# Altium footprint library con-molex.PCBLIB: 369 footprints (part 19 of 26)
Each footprint in its own frame and in the unit in brackets; x right, y up, seen from the top. Pads: shape width x height; smd on the part's side, far side on the other; paste and mask are expansions set on the pad; w line width, h text height; cw(c..) or ccw(c..) is an arc to the next point about the centre after c.
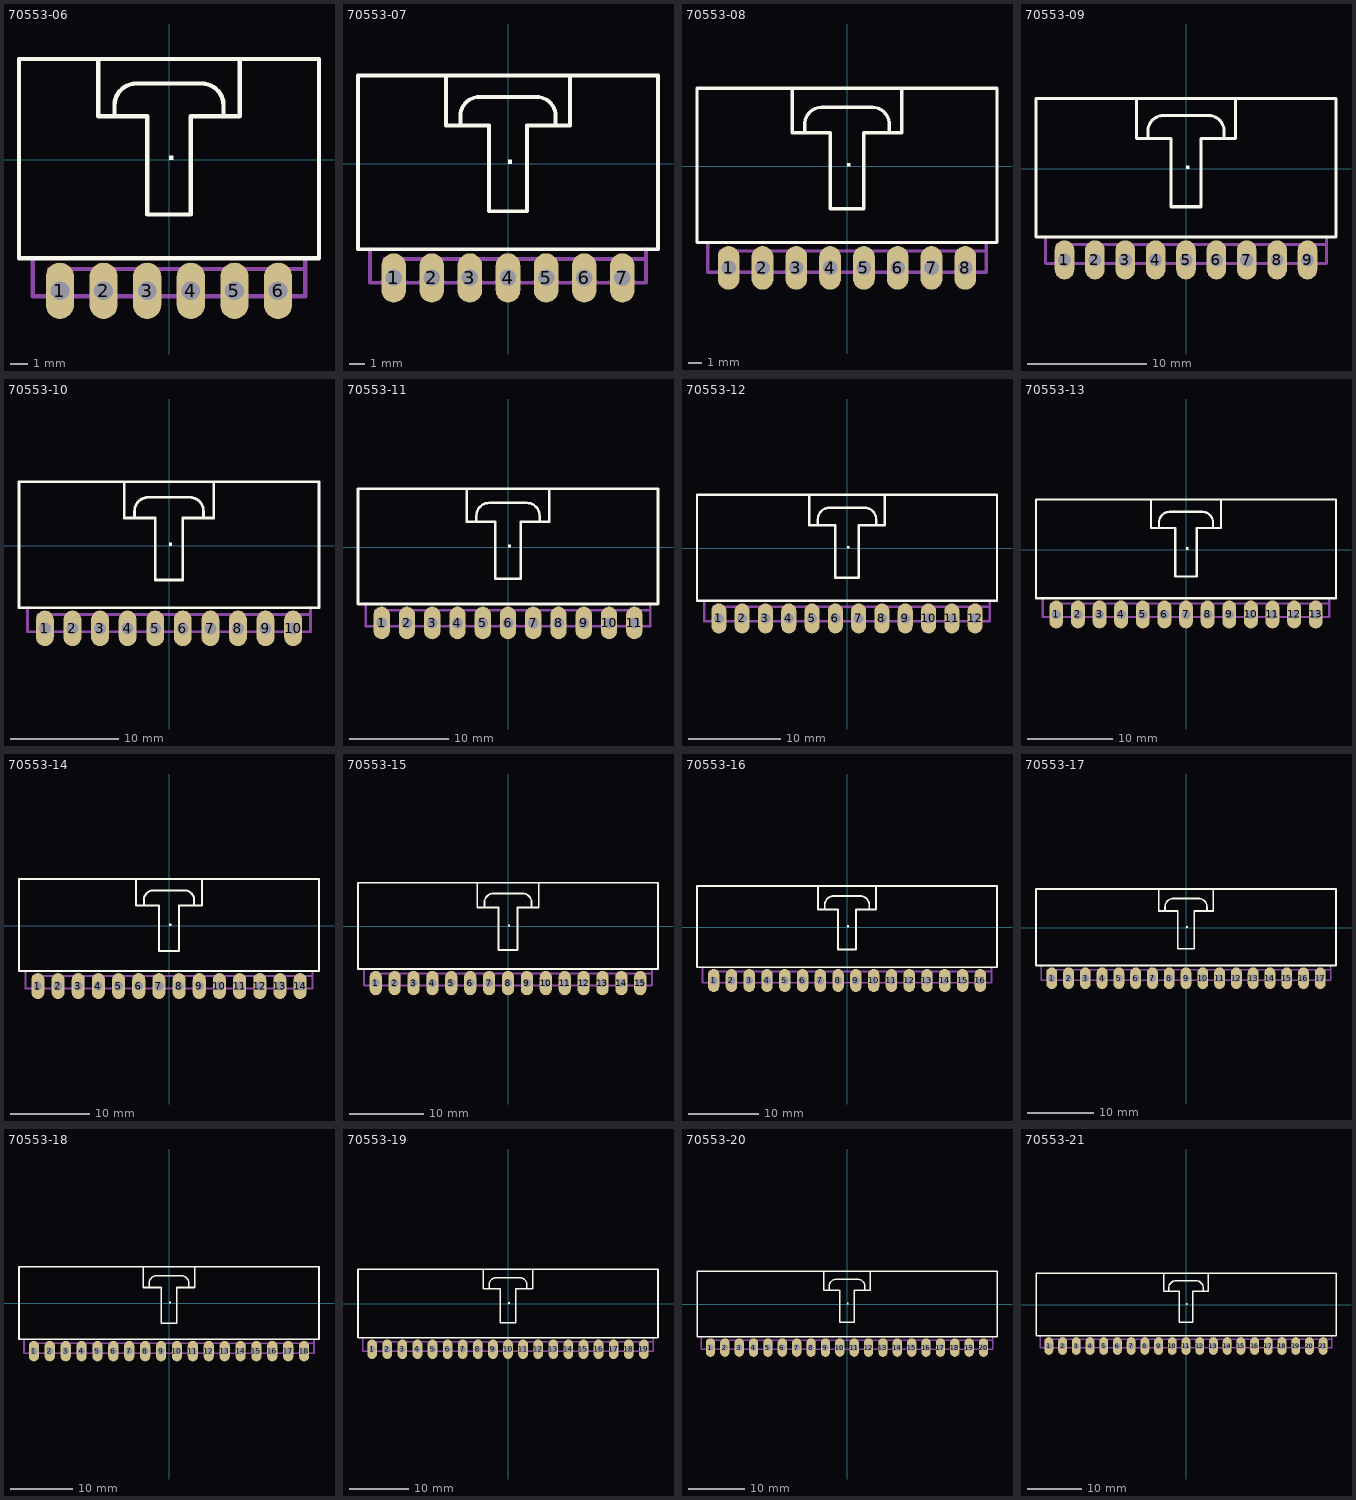
[diagram p18: the footprints below, top view; thin cyan lines are the x and y axes]

## 70553-06 [mil]
pads (6):
  oval 64.5x129 hole 43: 1(-250,-300) 2(-150,-300) 3(-50,-300) 4(50,-300) 5(150,-300) 6(250,-300)
Top Overlay:
  region: 0,0 10,0 10,10 0,10
  lines w10: -162.5,231.25 -162.5,100 -125,100 ; -125,100 -50,100 -50,-125 50,-125 50,100 125,100 ; -125,100 -125,125 cw(c-75,125) -75,175 75,175 cw(c75,125) 125,125 125,100 ; 125,100 162.5,100 162.5,231.25 ; 162.5,231.25 343.75,231.25 343.75,-225 -343.75,-225 -343.75,231.25 162.5,231.25
Mechanical 16:
  rectangle: -262.5,-300 -237.5,-250
  rectangle: -162.5,-300 -137.5,-250
  rectangle: -62.5,-300 -37.5,-250
  rectangle: 37.5,-300 62.5,-250
  rectangle: 137.5,-300 162.5,-250
  rectangle: 237.5,-300 262.5,-250
  lines w5: -275,-250 -225,-250 ; -175,-250 -125,-250 ; -75,-250 -25,-250 ; 25,-250 75,-250 ; 125,-250 175,-250 ; 225,-250 275,-250
  lines w10: -312.5,-225 -312.5,-312.5 -285,-312.5 ccw(c-285,-302.5) -275,-302.5 -275,-250 ; 312.5,-225 312.5,-250 ; 312.5,-250 312.5,-312.5 285,-312.5 cw(c285,-302.5) 275,-302.5 275,-250 312.5,-250 ; -225,-302.5 -225,-250 -175,-250 -175,-302.5 cw(c-185,-302.5) -185,-312.5 -215,-312.5 cw(c-215,-302.5) -225,-302.5 ; -125,-302.5 -125,-250 -75,-250 -75,-302.5 cw(c-85,-302.5) -85,-312.5 -115,-312.5 cw(c-115,-302.5) -125,-302.5 ; -25,-302.5 -25,-250 25,-250 25,-302.5 cw(c15,-302.5) 15,-312.5 -15,-312.5 cw(c-15,-302.5) -25,-302.5 ; 75,-302.5 75,-250 125,-250 125,-302.5 cw(c115,-302.5) 115,-312.5 85,-312.5 cw(c85,-302.5) 75,-302.5 ; 175,-302.5 175,-250 225,-250 225,-302.5 cw(c215,-302.5) 215,-312.5 185,-312.5 cw(c185,-302.5) 175,-302.5

## 70553-07 [mil]
pads (7):
  oval 64.5x129 hole 43: 1(-300,-300) 2(-200,-300) 3(-100,-300) 4(0,-300) 5(100,-300) 6(200,-300) 7(300,-300)
Top Overlay:
  region: 0,0 10,0 10,10 0,10
  lines w10: -162.5,231.25 -162.5,100 -125,100 ; -125,100 -50,100 -50,-125 50,-125 50,100 125,100 ; -125,100 -125,125 cw(c-75,125) -75,175 75,175 cw(c75,125) 125,125 125,100 ; 125,100 162.5,100 162.5,231.25 ; 162.5,231.25 393.75,231.25 393.75,-225 -393.75,-225 -393.75,231.25 162.5,231.25
Mechanical 16:
  rectangle: -312.5,-300 -287.5,-250
  rectangle: -212.5,-300 -187.5,-250
  rectangle: -112.5,-300 -87.5,-250
  rectangle: -12.5,-300 12.5,-250
  rectangle: 87.5,-300 112.5,-250
  rectangle: 187.5,-300 212.5,-250
  rectangle: 287.5,-300 312.5,-250
  lines w5: -325,-250 -275,-250 ; -225,-250 -175,-250 ; -125,-250 -75,-250 ; -25,-250 25,-250 ; 75,-250 125,-250 ; 175,-250 225,-250 ; 275,-250 325,-250
  lines w10: -362.5,-225 -362.5,-312.5 -335,-312.5 ccw(c-335,-302.5) -325,-302.5 -325,-250 ; 362.5,-225 362.5,-250 ; 362.5,-250 362.5,-312.5 335,-312.5 cw(c335,-302.5) 325,-302.5 325,-250 362.5,-250 ; -275,-302.5 -275,-250 -225,-250 -225,-302.5 cw(c-235,-302.5) -235,-312.5 -265,-312.5 cw(c-265,-302.5) -275,-302.5 ; -175,-302.5 -175,-250 -125,-250 -125,-302.5 cw(c-135,-302.5) -135,-312.5 -165,-312.5 cw(c-165,-302.5) -175,-302.5 ; -75,-302.5 -75,-250 -25,-250 -25,-302.5 cw(c-35,-302.5) -35,-312.5 -65,-312.5 cw(c-65,-302.5) -75,-302.5 ; 25,-302.5 25,-250 75,-250 75,-302.5 cw(c65,-302.5) 65,-312.5 35,-312.5 cw(c35,-302.5) 25,-302.5 ; 125,-302.5 125,-250 175,-250 175,-302.5 cw(c165,-302.5) 165,-312.5 135,-312.5 cw(c135,-302.5) 125,-302.5 ; 225,-302.5 225,-250 275,-250 275,-302.5 cw(c265,-302.5) 265,-312.5 235,-312.5 cw(c235,-302.5) 225,-302.5

## 70553-08 [mil]
pads (8):
  oval 64.5x129 hole 43: 1(-350,-300) 2(-250,-300) 3(-150,-300) 4(-50,-300) 5(50,-300) 6(150,-300) 7(250,-300) 8(350,-300)
Top Overlay:
  region: 0,0 10,0 10,10 0,10
  lines w10: -162.5,231.25 -162.5,100 -125,100 ; -125,100 -50,100 -50,-125 50,-125 50,100 125,100 ; -125,100 -125,125 cw(c-75,125) -75,175 75,175 cw(c75,125) 125,125 125,100 ; 125,100 162.5,100 162.5,231.25 ; 162.5,231.25 443.75,231.25 443.75,-225 -443.75,-225 -443.75,231.25 162.5,231.25
Mechanical 16:
  rectangle: -362.5,-300 -337.5,-250
  rectangle: -262.5,-300 -237.5,-250
  rectangle: -162.5,-300 -137.5,-250
  rectangle: -62.5,-300 -37.5,-250
  rectangle: 37.5,-300 62.5,-250
  rectangle: 137.5,-300 162.5,-250
  rectangle: 237.5,-300 262.5,-250
  rectangle: 337.5,-300 362.5,-250
  lines w5: -375,-250 -325,-250 ; -275,-250 -225,-250 ; -175,-250 -125,-250 ; -75,-250 -25,-250 ; 25,-250 75,-250 ; 125,-250 175,-250 ; 225,-250 275,-250 ; 325,-250 375,-250
  lines w10: -412.5,-225 -412.5,-312.5 -385,-312.5 ccw(c-385,-302.5) -375,-302.5 -375,-250 ; 412.5,-225 412.5,-250 ; 412.5,-250 412.5,-312.5 385,-312.5 cw(c385,-302.5) 375,-302.5 375,-250 412.5,-250 ; -325,-302.5 -325,-250 -275,-250 -275,-302.5 cw(c-285,-302.5) -285,-312.5 -315,-312.5 cw(c-315,-302.5) -325,-302.5 ; -225,-302.5 -225,-250 -175,-250 -175,-302.5 cw(c-185,-302.5) -185,-312.5 -215,-312.5 cw(c-215,-302.5) -225,-302.5 ; -125,-302.5 -125,-250 -75,-250 -75,-302.5 cw(c-85,-302.5) -85,-312.5 -115,-312.5 cw(c-115,-302.5) -125,-302.5 ; -25,-302.5 -25,-250 25,-250 25,-302.5 cw(c15,-302.5) 15,-312.5 -15,-312.5 cw(c-15,-302.5) -25,-302.5 ; 75,-302.5 75,-250 125,-250 125,-302.5 cw(c115,-302.5) 115,-312.5 85,-312.5 cw(c85,-302.5) 75,-302.5 ; 175,-302.5 175,-250 225,-250 225,-302.5 cw(c215,-302.5) 215,-312.5 185,-312.5 cw(c185,-302.5) 175,-302.5 ; 275,-302.5 275,-250 325,-250 325,-302.5 cw(c315,-302.5) 315,-312.5 285,-312.5 cw(c285,-302.5) 275,-302.5

## 70553-09 [mil]
pads (9):
  oval 64.5x129 hole 43: 1(-400,-300) 2(-300,-300) 3(-200,-300) 4(-100,-300) 5(0,-300) 6(100,-300) 7(200,-300) 8(300,-300) 9(400,-300)
Top Overlay:
  region: 0,0 10,0 10,10 0,10
  lines w10: -162.5,231.25 -162.5,100 -125,100 ; -125,100 -50,100 -50,-125 50,-125 50,100 125,100 ; -125,100 -125,125 cw(c-75,125) -75,175 75,175 cw(c75,125) 125,125 125,100 ; 125,100 162.5,100 162.5,231.25 ; 162.5,231.25 493.75,231.25 493.75,-225 -493.75,-225 -493.75,231.25 162.5,231.25
Mechanical 16:
  rectangle: -412.5,-300 -387.5,-250
  rectangle: -312.5,-300 -287.5,-250
  rectangle: -212.5,-300 -187.5,-250
  rectangle: -112.5,-300 -87.5,-250
  rectangle: -12.5,-300 12.5,-250
  rectangle: 87.5,-300 112.5,-250
  rectangle: 187.5,-300 212.5,-250
  rectangle: 287.5,-300 312.5,-250
  rectangle: 387.5,-300 412.5,-250
  lines w5: -425,-250 -375,-250 ; -325,-250 -275,-250 ; -225,-250 -175,-250 ; -125,-250 -75,-250 ; -25,-250 25,-250 ; 75,-250 125,-250 ; 175,-250 225,-250 ; 275,-250 325,-250 ; 375,-250 425,-250
  lines w10: -462.5,-225 -462.5,-312.5 -435,-312.5 ccw(c-435,-302.5) -425,-302.5 -425,-250 ; 462.5,-225 462.5,-250 ; 462.5,-250 462.5,-312.5 435,-312.5 cw(c435,-302.5) 425,-302.5 425,-250 462.5,-250 ; -375,-302.5 -375,-250 -325,-250 -325,-302.5 cw(c-335,-302.5) -335,-312.5 -365,-312.5 cw(c-365,-302.5) -375,-302.5 ; -275,-302.5 -275,-250 -225,-250 -225,-302.5 cw(c-235,-302.5) -235,-312.5 -265,-312.5 cw(c-265,-302.5) -275,-302.5 ; -175,-302.5 -175,-250 -125,-250 -125,-302.5 cw(c-135,-302.5) -135,-312.5 -165,-312.5 cw(c-165,-302.5) -175,-302.5 ; -75,-302.5 -75,-250 -25,-250 -25,-302.5 cw(c-35,-302.5) -35,-312.5 -65,-312.5 cw(c-65,-302.5) -75,-302.5 ; 25,-302.5 25,-250 75,-250 75,-302.5 cw(c65,-302.5) 65,-312.5 35,-312.5 cw(c35,-302.5) 25,-302.5 ; 125,-302.5 125,-250 175,-250 175,-302.5 cw(c165,-302.5) 165,-312.5 135,-312.5 cw(c135,-302.5) 125,-302.5 ; 225,-302.5 225,-250 275,-250 275,-302.5 cw(c265,-302.5) 265,-312.5 235,-312.5 cw(c235,-302.5) 225,-302.5 ; 325,-302.5 325,-250 375,-250 375,-302.5 cw(c365,-302.5) 365,-312.5 335,-312.5 cw(c335,-302.5) 325,-302.5

## 70553-10 [mil]
pads (10):
  oval 64.5x129 hole 43: 1(-450,-300) 2(-350,-300) 3(-250,-300) 4(-150,-300) 5(-50,-300) 6(50,-300) 7(150,-300) 8(250,-300) 9(350,-300) 10(450,-300)
Top Overlay:
  region: 0,0 10,0 10,10 0,10
  lines w10: -162.5,231.25 -162.5,100 -125,100 ; -125,100 -50,100 -50,-125 50,-125 50,100 125,100 ; -125,100 -125,125 cw(c-75,125) -75,175 75,175 cw(c75,125) 125,125 125,100 ; 125,100 162.5,100 162.5,231.25 ; 162.5,231.25 543.75,231.25 543.75,-225 -543.75,-225 -543.75,231.25 162.5,231.25
Mechanical 16:
  rectangle: -462.5,-300 -437.5,-250
  rectangle: -362.5,-300 -337.5,-250
  rectangle: -262.5,-300 -237.5,-250
  rectangle: -162.5,-300 -137.5,-250
  rectangle: -62.5,-300 -37.5,-250
  rectangle: 37.5,-300 62.5,-250
  rectangle: 137.5,-300 162.5,-250
  rectangle: 237.5,-300 262.5,-250
  rectangle: 337.5,-300 362.5,-250
  rectangle: 437.5,-300 462.5,-250
  lines w5: -475,-250 -425,-250 ; -375,-250 -325,-250 ; -275,-250 -225,-250 ; -175,-250 -125,-250 ; -75,-250 -25,-250 ; 25,-250 75,-250 ; 125,-250 175,-250 ; 225,-250 275,-250 ; 325,-250 375,-250 ; 425,-250 475,-250
  lines w10: -512.5,-225 -512.5,-312.5 -485,-312.5 ccw(c-485,-302.5) -475,-302.5 -475,-250 ; 512.5,-225 512.5,-250 ; 512.5,-250 512.5,-312.5 485,-312.5 cw(c485,-302.5) 475,-302.5 475,-250 512.5,-250 ; -425,-302.5 -425,-250 -375,-250 -375,-302.5 cw(c-385,-302.5) -385,-312.5 -415,-312.5 cw(c-415,-302.5) -425,-302.5 ; -325,-302.5 -325,-250 -275,-250 -275,-302.5 cw(c-285,-302.5) -285,-312.5 -315,-312.5 cw(c-315,-302.5) -325,-302.5 ; -225,-302.5 -225,-250 -175,-250 -175,-302.5 cw(c-185,-302.5) -185,-312.5 -215,-312.5 cw(c-215,-302.5) -225,-302.5 ; -125,-302.5 -125,-250 -75,-250 -75,-302.5 cw(c-85,-302.5) -85,-312.5 -115,-312.5 cw(c-115,-302.5) -125,-302.5 ; -25,-302.5 -25,-250 25,-250 25,-302.5 cw(c15,-302.5) 15,-312.5 -15,-312.5 cw(c-15,-302.5) -25,-302.5 ; 75,-302.5 75,-250 125,-250 125,-302.5 cw(c115,-302.5) 115,-312.5 85,-312.5 cw(c85,-302.5) 75,-302.5 ; 175,-302.5 175,-250 225,-250 225,-302.5 cw(c215,-302.5) 215,-312.5 185,-312.5 cw(c185,-302.5) 175,-302.5 ; 275,-302.5 275,-250 325,-250 325,-302.5 cw(c315,-302.5) 315,-312.5 285,-312.5 cw(c285,-302.5) 275,-302.5 ; 375,-302.5 375,-250 425,-250 425,-302.5 cw(c415,-302.5) 415,-312.5 385,-312.5 cw(c385,-302.5) 375,-302.5

## 70553-11 [mil]
pads (11):
  oval 64.5x129 hole 43: 1(-500,-300) 2(-400,-300) 3(-300,-300) 4(-200,-300) 5(-100,-300) 6(0,-300) 7(100,-300) 8(200,-300) 9(300,-300) 10(400,-300) 11(500,-300)
Top Overlay:
  region: 0,0 10,0 10,10 0,10
  lines w10: -162.5,231.25 -162.5,100 -125,100 ; -125,100 -50,100 -50,-125 50,-125 50,100 125,100 ; -125,100 -125,125 cw(c-75,125) -75,175 75,175 cw(c75,125) 125,125 125,100 ; 125,100 162.5,100 162.5,231.25 ; 162.5,231.25 593.75,231.25 593.75,-225 -593.75,-225 -593.75,231.25 162.5,231.25
Mechanical 16:
  rectangle: -512.5,-300 -487.5,-250
  rectangle: -412.5,-300 -387.5,-250
  rectangle: -312.5,-300 -287.5,-250
  rectangle: -212.5,-300 -187.5,-250
  rectangle: -112.5,-300 -87.5,-250
  rectangle: -12.5,-300 12.5,-250
  rectangle: 87.5,-300 112.5,-250
  rectangle: 187.5,-300 212.5,-250
  rectangle: 287.5,-300 312.5,-250
  rectangle: 387.5,-300 412.5,-250
  rectangle: 487.5,-300 512.5,-250
  lines w5: -525,-250 -475,-250 ; -425,-250 -375,-250 ; -325,-250 -275,-250 ; -225,-250 -175,-250 ; -125,-250 -75,-250 ; -25,-250 25,-250 ; 75,-250 125,-250 ; 175,-250 225,-250 ; 275,-250 325,-250 ; 375,-250 425,-250 ; 475,-250 525,-250
  lines w10: -562.5,-225 -562.5,-312.5 -535,-312.5 ccw(c-535,-302.5) -525,-302.5 -525,-250 ; 562.5,-225 562.5,-250 ; 562.5,-250 562.5,-312.5 535,-312.5 cw(c535,-302.5) 525,-302.5 525,-250 562.5,-250 ; -475,-302.5 -475,-250 -425,-250 -425,-302.5 cw(c-435,-302.5) -435,-312.5 -465,-312.5 cw(c-465,-302.5) -475,-302.5 ; -375,-302.5 -375,-250 -325,-250 -325,-302.5 cw(c-335,-302.5) -335,-312.5 -365,-312.5 cw(c-365,-302.5) -375,-302.5 ; -275,-302.5 -275,-250 -225,-250 -225,-302.5 cw(c-235,-302.5) -235,-312.5 -265,-312.5 cw(c-265,-302.5) -275,-302.5 ; -175,-302.5 -175,-250 -125,-250 -125,-302.5 cw(c-135,-302.5) -135,-312.5 -165,-312.5 cw(c-165,-302.5) -175,-302.5 ; -75,-302.5 -75,-250 -25,-250 -25,-302.5 cw(c-35,-302.5) -35,-312.5 -65,-312.5 cw(c-65,-302.5) -75,-302.5 ; 25,-302.5 25,-250 75,-250 75,-302.5 cw(c65,-302.5) 65,-312.5 35,-312.5 cw(c35,-302.5) 25,-302.5 ; 125,-302.5 125,-250 175,-250 175,-302.5 cw(c165,-302.5) 165,-312.5 135,-312.5 cw(c135,-302.5) 125,-302.5 ; 225,-302.5 225,-250 275,-250 275,-302.5 cw(c265,-302.5) 265,-312.5 235,-312.5 cw(c235,-302.5) 225,-302.5 ; 325,-302.5 325,-250 375,-250 375,-302.5 cw(c365,-302.5) 365,-312.5 335,-312.5 cw(c335,-302.5) 325,-302.5 ; 425,-302.5 425,-250 475,-250 475,-302.5 cw(c465,-302.5) 465,-312.5 435,-312.5 cw(c435,-302.5) 425,-302.5

## 70553-12 [mil]
pads (12):
  oval 64.5x129 hole 43: 1(-550,-300) 2(-450,-300) 3(-350,-300) 4(-250,-300) 5(-150,-300) 6(-50,-300) 7(50,-300) 8(150,-300) 9(250,-300) 10(350,-300) 11(450,-300) 12(550,-300)
Top Overlay:
  region: 0,0 10,0 10,10 0,10
  lines w10: -162.5,231.25 -162.5,100 -125,100 ; -125,100 -50,100 -50,-125 50,-125 50,100 125,100 ; -125,100 -125,125 cw(c-75,125) -75,175 75,175 cw(c75,125) 125,125 125,100 ; 125,100 162.5,100 162.5,231.25 ; 162.5,231.25 643.75,231.25 643.75,-225 -643.75,-225 -643.75,231.25 162.5,231.25
Mechanical 16:
  rectangle: -562.5,-300 -537.5,-250
  rectangle: -462.5,-300 -437.5,-250
  rectangle: -362.5,-300 -337.5,-250
  rectangle: -262.5,-300 -237.5,-250
  rectangle: -162.5,-300 -137.5,-250
  rectangle: -62.5,-300 -37.5,-250
  rectangle: 37.5,-300 62.5,-250
  rectangle: 137.5,-300 162.5,-250
  rectangle: 237.5,-300 262.5,-250
  rectangle: 337.5,-300 362.5,-250
  rectangle: 437.5,-300 462.5,-250
  rectangle: 537.5,-300 562.5,-250
  lines w5: -575,-250 -525,-250 ; -475,-250 -425,-250 ; -375,-250 -325,-250 ; -275,-250 -225,-250 ; -175,-250 -125,-250 ; -75,-250 -25,-250 ; 25,-250 75,-250 ; 125,-250 175,-250 ; 225,-250 275,-250 ; 325,-250 375,-250 ; 425,-250 475,-250 ; 525,-250 575,-250
  lines w10: -612.5,-225 -612.5,-312.5 -585,-312.5 ccw(c-585,-302.5) -575,-302.5 -575,-250 ; 612.5,-225 612.5,-250 ; 612.5,-250 612.5,-312.5 585,-312.5 cw(c585,-302.5) 575,-302.5 575,-250 612.5,-250 ; -525,-302.5 -525,-250 -475,-250 -475,-302.5 cw(c-485,-302.5) -485,-312.5 -515,-312.5 cw(c-515,-302.5) -525,-302.5 ; -425,-302.5 -425,-250 -375,-250 -375,-302.5 cw(c-385,-302.5) -385,-312.5 -415,-312.5 cw(c-415,-302.5) -425,-302.5 ; -325,-302.5 -325,-250 -275,-250 -275,-302.5 cw(c-285,-302.5) -285,-312.5 -315,-312.5 cw(c-315,-302.5) -325,-302.5 ; -225,-302.5 -225,-250 -175,-250 -175,-302.5 cw(c-185,-302.5) -185,-312.5 -215,-312.5 cw(c-215,-302.5) -225,-302.5 ; -125,-302.5 -125,-250 -75,-250 -75,-302.5 cw(c-85,-302.5) -85,-312.5 -115,-312.5 cw(c-115,-302.5) -125,-302.5 ; -25,-302.5 -25,-250 25,-250 25,-302.5 cw(c15,-302.5) 15,-312.5 -15,-312.5 cw(c-15,-302.5) -25,-302.5 ; 75,-302.5 75,-250 125,-250 125,-302.5 cw(c115,-302.5) 115,-312.5 85,-312.5 cw(c85,-302.5) 75,-302.5 ; 175,-302.5 175,-250 225,-250 225,-302.5 cw(c215,-302.5) 215,-312.5 185,-312.5 cw(c185,-302.5) 175,-302.5 ; 275,-302.5 275,-250 325,-250 325,-302.5 cw(c315,-302.5) 315,-312.5 285,-312.5 cw(c285,-302.5) 275,-302.5 ; 375,-302.5 375,-250 425,-250 425,-302.5 cw(c415,-302.5) 415,-312.5 385,-312.5 cw(c385,-302.5) 375,-302.5 ; 475,-302.5 475,-250 525,-250 525,-302.5 cw(c515,-302.5) 515,-312.5 485,-312.5 cw(c485,-302.5) 475,-302.5

## 70553-13 [mil]
pads (13):
  oval 64.5x129 hole 43: 1(-600,-300) 2(-500,-300) 3(-400,-300) 4(-300,-300) 5(-200,-300) 6(-100,-300) 7(0,-300) 8(100,-300) 9(200,-300) 10(300,-300) 11(400,-300) 12(500,-300) 13(600,-300)
Top Overlay:
  region: 0,0 10,0 10,10 0,10
  lines w10: -162.5,231.25 -162.5,100 -125,100 ; -125,100 -50,100 -50,-125 50,-125 50,100 125,100 ; -125,100 -125,125 cw(c-75,125) -75,175 75,175 cw(c75,125) 125,125 125,100 ; 125,100 162.5,100 162.5,231.25 ; 162.5,231.25 693.75,231.25 693.75,-225 -693.75,-225 -693.75,231.25 162.5,231.25
Mechanical 16:
  rectangle: -612.5,-300 -587.5,-250
  rectangle: -512.5,-300 -487.5,-250
  rectangle: -412.5,-300 -387.5,-250
  rectangle: -312.5,-300 -287.5,-250
  rectangle: -212.5,-300 -187.5,-250
  rectangle: -112.5,-300 -87.5,-250
  rectangle: -12.5,-300 12.5,-250
  rectangle: 87.5,-300 112.5,-250
  rectangle: 187.5,-300 212.5,-250
  rectangle: 287.5,-300 312.5,-250
  rectangle: 587.5,-300 612.5,-250
  rectangle: 387.5,-300 412.5,-250
  rectangle: 487.5,-300 512.5,-250
  lines w5: -625,-250 -575,-250 ; -525,-250 -475,-250 ; -425,-250 -375,-250 ; -325,-250 -275,-250 ; -225,-250 -175,-250 ; -125,-250 -75,-250 ; -25,-250 25,-250 ; 75,-250 125,-250 ; 175,-250 225,-250 ; 275,-250 325,-250 ; 375,-250 425,-250 ; 475,-250 525,-250 ; 575,-250 625,-250
  lines w10: -662.5,-225 -662.5,-312.5 -635,-312.5 ccw(c-635,-302.5) -625,-302.5 -625,-250 ; 662.5,-225 662.5,-250 ; 662.5,-250 662.5,-312.5 635,-312.5 cw(c635,-302.5) 625,-302.5 625,-250 662.5,-250 ; -575,-302.5 -575,-250 -525,-250 -525,-302.5 cw(c-535,-302.5) -535,-312.5 -565,-312.5 cw(c-565,-302.5) -575,-302.5 ; -475,-302.5 -475,-250 -425,-250 -425,-302.5 cw(c-435,-302.5) -435,-312.5 -465,-312.5 cw(c-465,-302.5) -475,-302.5 ; -375,-302.5 -375,-250 -325,-250 -325,-302.5 cw(c-335,-302.5) -335,-312.5 -365,-312.5 cw(c-365,-302.5) -375,-302.5 ; -275,-302.5 -275,-250 -225,-250 -225,-302.5 cw(c-235,-302.5) -235,-312.5 -265,-312.5 cw(c-265,-302.5) -275,-302.5 ; -175,-302.5 -175,-250 -125,-250 -125,-302.5 cw(c-135,-302.5) -135,-312.5 -165,-312.5 cw(c-165,-302.5) -175,-302.5 ; -75,-302.5 -75,-250 -25,-250 -25,-302.5 cw(c-35,-302.5) -35,-312.5 -65,-312.5 cw(c-65,-302.5) -75,-302.5 ; 25,-302.5 25,-250 75,-250 75,-302.5 cw(c65,-302.5) 65,-312.5 35,-312.5 cw(c35,-302.5) 25,-302.5 ; 125,-302.5 125,-250 175,-250 175,-302.5 cw(c165,-302.5) 165,-312.5 135,-312.5 cw(c135,-302.5) 125,-302.5 ; 225,-302.5 225,-250 275,-250 275,-302.5 cw(c265,-302.5) 265,-312.5 235,-312.5 cw(c235,-302.5) 225,-302.5 ; 325,-302.5 325,-250 375,-250 375,-302.5 cw(c365,-302.5) 365,-312.5 335,-312.5 cw(c335,-302.5) 325,-302.5 ; 425,-302.5 425,-250 475,-250 475,-302.5 cw(c465,-302.5) 465,-312.5 435,-312.5 cw(c435,-302.5) 425,-302.5 ; 525,-302.5 525,-250 575,-250 575,-302.5 cw(c565,-302.5) 565,-312.5 535,-312.5 cw(c535,-302.5) 525,-302.5

## 70553-14 [mil]
pads (14):
  oval 64.5x129 hole 43: 1(-650,-300) 2(-550,-300) 3(-450,-300) 4(-350,-300) 5(-250,-300) 6(-150,-300) 7(-50,-300) 8(50,-300) 9(150,-300) 10(250,-300) 11(350,-300) 12(450,-300) 13(550,-300) 14(650,-300)
Top Overlay:
  region: 0,0 10,0 10,10 0,10
  lines w10: -162.5,231.25 -162.5,100 -125,100 ; -125,100 -50,100 -50,-125 50,-125 50,100 125,100 ; -125,100 -125,125 cw(c-75,125) -75,175 75,175 cw(c75,125) 125,125 125,100 ; 125,100 162.5,100 162.5,231.25 ; 162.5,231.25 743.75,231.25 743.75,-225 -743.75,-225 -743.75,231.25 162.5,231.25
Mechanical 16:
  rectangle: -662.5,-300 -637.5,-250
  rectangle: -562.5,-300 -537.5,-250
  rectangle: -462.5,-300 -437.5,-250
  rectangle: -362.5,-300 -337.5,-250
  rectangle: -262.5,-300 -237.5,-250
  rectangle: -162.5,-300 -137.5,-250
  rectangle: -62.5,-300 -37.5,-250
  rectangle: 37.5,-300 62.5,-250
  rectangle: 137.5,-300 162.5,-250
  rectangle: 237.5,-300 262.5,-250
  rectangle: 637.5,-300 662.5,-250
  rectangle: 337.5,-300 362.5,-250
  rectangle: 437.5,-300 462.5,-250
  rectangle: 537.5,-300 562.5,-250
  lines w5: -675,-250 -625,-250 ; -575,-250 -525,-250 ; -475,-250 -425,-250 ; -375,-250 -325,-250 ; -275,-250 -225,-250 ; -175,-250 -125,-250 ; -75,-250 -25,-250 ; 25,-250 75,-250 ; 125,-250 175,-250 ; 225,-250 275,-250 ; 325,-250 375,-250 ; 525,-250 575,-250 ; 625,-250 675,-250
  lines w10: -712.5,-225 -712.5,-312.5 -685,-312.5 ccw(c-685,-302.5) -675,-302.5 -675,-250 ; 712.5,-225 712.5,-250 ; 425,-250 375,-250 375,-302.5 ccw(c385,-302.5) 385,-312.5 415,-312.5 ccw(c415,-302.5) 425,-302.5 425,-250 ; 425,-250 475,-250 ; 475,-250 525,-250 525,-302.5 cw(c515,-302.5) 515,-312.5 485,-312.5 cw(c485,-302.5) 475,-302.5 475,-250 ; 712.5,-250 712.5,-312.5 685,-312.5 cw(c685,-302.5) 675,-302.5 675,-250 712.5,-250 ; -625,-302.5 -625,-250 -575,-250 -575,-302.5 cw(c-585,-302.5) -585,-312.5 -615,-312.5 cw(c-615,-302.5) -625,-302.5 ; -525,-302.5 -525,-250 -475,-250 -475,-302.5 cw(c-485,-302.5) -485,-312.5 -515,-312.5 cw(c-515,-302.5) -525,-302.5 ; -425,-302.5 -425,-250 -375,-250 -375,-302.5 cw(c-385,-302.5) -385,-312.5 -415,-312.5 cw(c-415,-302.5) -425,-302.5 ; -325,-302.5 -325,-250 -275,-250 -275,-302.5 cw(c-285,-302.5) -285,-312.5 -315,-312.5 cw(c-315,-302.5) -325,-302.5 ; -225,-302.5 -225,-250 -175,-250 -175,-302.5 cw(c-185,-302.5) -185,-312.5 -215,-312.5 cw(c-215,-302.5) -225,-302.5 ; -125,-302.5 -125,-250 -75,-250 -75,-302.5 cw(c-85,-302.5) -85,-312.5 -115,-312.5 cw(c-115,-302.5) -125,-302.5 ; -25,-302.5 -25,-250 25,-250 25,-302.5 cw(c15,-302.5) 15,-312.5 -15,-312.5 cw(c-15,-302.5) -25,-302.5 ; 75,-302.5 75,-250 125,-250 125,-302.5 cw(c115,-302.5) 115,-312.5 85,-312.5 cw(c85,-302.5) 75,-302.5 ; 175,-302.5 175,-250 225,-250 225,-302.5 cw(c215,-302.5) 215,-312.5 185,-312.5 cw(c185,-302.5) 175,-302.5 ; 275,-302.5 275,-250 325,-250 325,-302.5 cw(c315,-302.5) 315,-312.5 285,-312.5 cw(c285,-302.5) 275,-302.5 ; 575,-302.5 575,-250 625,-250 625,-302.5 cw(c615,-302.5) 615,-312.5 585,-312.5 cw(c585,-302.5) 575,-302.5

## 70553-15 [mil]
pads (15):
  oval 64.5x129 hole 43: 1(-700,-300) 2(-600,-300) 3(-500,-300) 4(-400,-300) 5(-300,-300) 6(-200,-300) 7(-100,-300) 8(0,-300) 9(100,-300) 10(200,-300) 11(300,-300) 12(400,-300) 13(500,-300) 14(600,-300) 15(700,-300)
Top Overlay:
  region: 0,0 10,0 10,10 0,10
  lines w10: -162.5,231.25 -162.5,100 -125,100 ; -125,100 -50,100 -50,-125 50,-125 50,100 125,100 ; -125,100 -125,125 cw(c-75,125) -75,175 75,175 cw(c75,125) 125,125 125,100 ; 125,100 162.5,100 162.5,231.25 ; 162.5,231.25 793.75,231.25 793.75,-225 -793.75,-225 -793.75,231.25 162.5,231.25
Mechanical 16:
  rectangle: -712.5,-300 -687.5,-250
  rectangle: -612.5,-300 -587.5,-250
  rectangle: -512.5,-300 -487.5,-250
  rectangle: -412.5,-300 -387.5,-250
  rectangle: -312.5,-300 -287.5,-250
  rectangle: -212.5,-300 -187.5,-250
  rectangle: -112.5,-300 -87.5,-250
  rectangle: -12.5,-300 12.5,-250
  rectangle: 87.5,-300 112.5,-250
  rectangle: 187.5,-300 212.5,-250
  rectangle: 687.5,-300 712.5,-250
  rectangle: 287.5,-300 312.5,-250
  rectangle: 387.5,-300 412.5,-250
  rectangle: 487.5,-300 512.5,-250
  rectangle: 587.5,-300 612.5,-250
  lines w5: -725,-250 -675,-250 ; -625,-250 -575,-250 ; -525,-250 -475,-250 ; -425,-250 -375,-250 ; -325,-250 -275,-250 ; -225,-250 -175,-250 ; -125,-250 -75,-250 ; -25,-250 25,-250 ; 75,-250 125,-250 ; 175,-250 225,-250 ; 275,-250 325,-250 ; 475,-250 525,-250
  lines w10: -762.5,-225 -762.5,-312.5 -735,-312.5 ccw(c-735,-302.5) -725,-302.5 -725,-250 ; 625,-250 625,-302.5 ccw(c635,-302.5) 635,-312.5 665,-312.5 ccw(c665,-302.5) 675,-302.5 675,-250 ; 762.5,-225 762.5,-250 ; 375,-250 325,-250 325,-302.5 ccw(c335,-302.5) 335,-312.5 365,-312.5 ccw(c365,-302.5) 375,-302.5 375,-250 ; 375,-250 425,-250 ; 425,-250 475,-250 475,-302.5 cw(c465,-302.5) 465,-312.5 435,-312.5 cw(c435,-302.5) 425,-302.5 425,-250 ; 575,-250 725,-250 ; 575,-250 525,-250 525,-302.5 ccw(c535,-302.5) 535,-312.5 565,-312.5 ccw(c565,-302.5) 575,-302.5 575,-250 ; 725,-250 725,-302.5 ccw(c735,-302.5) 735,-312.5 762.5,-312.5 762.5,-250 ; 725,-250 762.5,-250 ; -675,-302.5 -675,-250 -625,-250 -625,-302.5 cw(c-635,-302.5) -635,-312.5 -665,-312.5 cw(c-665,-302.5) -675,-302.5 ; -575,-302.5 -575,-250 -525,-250 -525,-302.5 cw(c-535,-302.5) -535,-312.5 -565,-312.5 cw(c-565,-302.5) -575,-302.5 ; -475,-302.5 -475,-250 -425,-250 -425,-302.5 cw(c-435,-302.5) -435,-312.5 -465,-312.5 cw(c-465,-302.5) -475,-302.5 ; -375,-302.5 -375,-250 -325,-250 -325,-302.5 cw(c-335,-302.5) -335,-312.5 -365,-312.5 cw(c-365,-302.5) -375,-302.5 ; -275,-302.5 -275,-250 -225,-250 -225,-302.5 cw(c-235,-302.5) -235,-312.5 -265,-312.5 cw(c-265,-302.5) -275,-302.5 ; -175,-302.5 -175,-250 -125,-250 -125,-302.5 cw(c-135,-302.5) -135,-312.5 -165,-312.5 cw(c-165,-302.5) -175,-302.5 ; -75,-302.5 -75,-250 -25,-250 -25,-302.5 cw(c-35,-302.5) -35,-312.5 -65,-312.5 cw(c-65,-302.5) -75,-302.5 ; 25,-302.5 25,-250 75,-250 75,-302.5 cw(c65,-302.5) 65,-312.5 35,-312.5 cw(c35,-302.5) 25,-302.5 ; 125,-302.5 125,-250 175,-250 175,-302.5 cw(c165,-302.5) 165,-312.5 135,-312.5 cw(c135,-302.5) 125,-302.5 ; 225,-302.5 225,-250 275,-250 275,-302.5 cw(c265,-302.5) 265,-312.5 235,-312.5 cw(c235,-302.5) 225,-302.5

## 70553-16 [mil]
pads (16):
  oval 64.5x129 hole 43: 1(-750,-300) 2(-650,-300) 3(-550,-300) 4(-450,-300) 5(-350,-300) 6(-250,-300) 7(-150,-300) 8(-50,-300) 9(50,-300) 10(150,-300) 11(250,-300) 12(350,-300) 13(450,-300) 14(550,-300) 15(650,-300) 16(750,-300)
Top Overlay:
  region: 0,0 10,0 10,10 0,10
  lines w10: -162.5,231.25 -162.5,100 -125,100 ; -125,100 -50,100 -50,-125 50,-125 50,100 125,100 ; -125,100 -125,125 cw(c-75,125) -75,175 75,175 cw(c75,125) 125,125 125,100 ; 125,100 162.5,100 162.5,231.25 ; 162.5,231.25 843.75,231.25 843.75,-225 -843.75,-225 -843.75,231.25 162.5,231.25
Mechanical 16:
  rectangle: -762.5,-300 -737.5,-250
  rectangle: -662.5,-300 -637.5,-250
  rectangle: -562.5,-300 -537.5,-250
  rectangle: -462.5,-300 -437.5,-250
  rectangle: -362.5,-300 -337.5,-250
  rectangle: -262.5,-300 -237.5,-250
  rectangle: -162.5,-300 -137.5,-250
  rectangle: -62.5,-300 -37.5,-250
  rectangle: 37.5,-300 62.5,-250
  rectangle: 137.5,-300 162.5,-250
  rectangle: 737.5,-300 762.5,-250
  rectangle: 237.5,-300 262.5,-250
  rectangle: 337.5,-300 362.5,-250
  rectangle: 437.5,-300 462.5,-250
  rectangle: 537.5,-300 562.5,-250
  rectangle: 637.5,-300 662.5,-250
  lines w5: -775,-250 -725,-250 ; -675,-250 -625,-250 ; -575,-250 -525,-250 ; -475,-250 -425,-250 ; -375,-250 -325,-250 ; -275,-250 -225,-250 ; -175,-250 -125,-250 ; -75,-250 -25,-250 ; 25,-250 75,-250 ; 125,-250 175,-250 ; 225,-250 275,-250 ; 425,-250 475,-250 ; 725,-250 775,-250
  lines w10: -812.5,-225 -812.5,-312.5 -785,-312.5 ccw(c-785,-302.5) -775,-302.5 -775,-250 ; 575,-250 575,-302.5 ccw(c585,-302.5) 585,-312.5 615,-312.5 ccw(c615,-302.5) 625,-302.5 625,-250 ; 812.5,-225 812.5,-250 ; 325,-250 275,-250 275,-302.5 ccw(c285,-302.5) 285,-312.5 315,-312.5 ccw(c315,-302.5) 325,-302.5 325,-250 ; 325,-250 375,-250 ; 375,-250 425,-250 425,-302.5 cw(c415,-302.5) 415,-312.5 385,-312.5 cw(c385,-302.5) 375,-302.5 375,-250 ; 525,-250 675,-250 ; 525,-250 475,-250 475,-302.5 ccw(c485,-302.5) 485,-312.5 515,-312.5 ccw(c515,-302.5) 525,-302.5 525,-250 ; 675,-250 725,-250 725,-302.5 cw(c715,-302.5) 715,-312.5 685,-312.5 cw(c685,-302.5) 675,-302.5 675,-250 ; 812.5,-250 812.5,-312.5 785,-312.5 cw(c785,-302.5) 775,-302.5 775,-250 812.5,-250 ; -725,-302.5 -725,-250 -675,-250 -675,-302.5 cw(c-685,-302.5) -685,-312.5 -715,-312.5 cw(c-715,-302.5) -725,-302.5 ; -625,-302.5 -625,-250 -575,-250 -575,-302.5 cw(c-585,-302.5) -585,-312.5 -615,-312.5 cw(c-615,-302.5) -625,-302.5 ; -525,-302.5 -525,-250 -475,-250 -475,-302.5 cw(c-485,-302.5) -485,-312.5 -515,-312.5 cw(c-515,-302.5) -525,-302.5 ; -425,-302.5 -425,-250 -375,-250 -375,-302.5 cw(c-385,-302.5) -385,-312.5 -415,-312.5 cw(c-415,-302.5) -425,-302.5 ; -325,-302.5 -325,-250 -275,-250 -275,-302.5 cw(c-285,-302.5) -285,-312.5 -315,-312.5 cw(c-315,-302.5) -325,-302.5 ; -225,-302.5 -225,-250 -175,-250 -175,-302.5 cw(c-185,-302.5) -185,-312.5 -215,-312.5 cw(c-215,-302.5) -225,-302.5 ; -125,-302.5 -125,-250 -75,-250 -75,-302.5 cw(c-85,-302.5) -85,-312.5 -115,-312.5 cw(c-115,-302.5) -125,-302.5 ; -25,-302.5 -25,-250 25,-250 25,-302.5 cw(c15,-302.5) 15,-312.5 -15,-312.5 cw(c-15,-302.5) -25,-302.5 ; 75,-302.5 75,-250 125,-250 125,-302.5 cw(c115,-302.5) 115,-312.5 85,-312.5 cw(c85,-302.5) 75,-302.5 ; 175,-302.5 175,-250 225,-250 225,-302.5 cw(c215,-302.5) 215,-312.5 185,-312.5 cw(c185,-302.5) 175,-302.5

## 70553-17 [mil]
pads (17):
  oval 64.5x129 hole 43: 1(-800,-300) 2(-700,-300) 3(-600,-300) 4(-500,-300) 5(-400,-300) 6(-300,-300) 7(-200,-300) 8(-100,-300) 9(0,-300) 10(100,-300) 11(200,-300) 12(300,-300) 13(400,-300) 14(500,-300) 15(600,-300) 16(700,-300) 17(800,-300)
Top Overlay:
  region: 0,0 10,0 10,10 0,10
  lines w10: -162.5,231.25 -162.5,100 -125,100 ; -125,100 -50,100 -50,-125 50,-125 50,100 125,100 ; -125,100 -125,125 cw(c-75,125) -75,175 75,175 cw(c75,125) 125,125 125,100 ; 125,100 162.5,100 162.5,231.25 ; 162.5,231.25 893.75,231.25 893.75,-225 -893.75,-225 -893.75,231.25 162.5,231.25
Mechanical 16:
  rectangle: -812.5,-300 -787.5,-250
  rectangle: -712.5,-300 -687.5,-250
  rectangle: -612.5,-300 -587.5,-250
  rectangle: -512.5,-300 -487.5,-250
  rectangle: -412.5,-300 -387.5,-250
  rectangle: -312.5,-300 -287.5,-250
  rectangle: -212.5,-300 -187.5,-250
  rectangle: -112.5,-300 -87.5,-250
  rectangle: -12.5,-300 12.5,-250
  rectangle: 87.5,-300 112.5,-250
  rectangle: 787.5,-300 812.5,-250
  rectangle: 187.5,-300 212.5,-250
  rectangle: 287.5,-300 312.5,-250
  rectangle: 387.5,-300 412.5,-250
  rectangle: 487.5,-300 512.5,-250
  rectangle: 587.5,-300 612.5,-250
  rectangle: 687.5,-300 712.5,-250
  lines w5: -825,-250 -775,-250 ; -725,-250 -675,-250 ; -625,-250 -575,-250 ; -525,-250 -475,-250 ; -425,-250 -375,-250 ; -325,-250 -275,-250 ; -225,-250 -175,-250 ; -125,-250 -75,-250 ; -25,-250 25,-250 ; 75,-250 125,-250 ; 175,-250 225,-250 ; 375,-250 425,-250 ; 675,-250 725,-250 ; 775,-250 825,-250
  lines w10: -862.5,-225 -862.5,-312.5 -835,-312.5 ccw(c-835,-302.5) -825,-302.5 -825,-250 ; 525,-250 525,-302.5 ccw(c535,-302.5) 535,-312.5 565,-312.5 ccw(c565,-302.5) 575,-302.5 575,-250 ; 862.5,-225 862.5,-250 ; 275,-250 225,-250 225,-302.5 ccw(c235,-302.5) 235,-312.5 265,-312.5 ccw(c265,-302.5) 275,-302.5 275,-250 ; 275,-250 325,-250 ; 325,-250 375,-250 375,-302.5 cw(c365,-302.5) 365,-312.5 335,-312.5 cw(c335,-302.5) 325,-302.5 325,-250 ; 475,-250 625,-250 ; 475,-250 425,-250 425,-302.5 ccw(c435,-302.5) 435,-312.5 465,-312.5 ccw(c465,-302.5) 475,-302.5 475,-250 ; 625,-250 675,-250 675,-302.5 cw(c665,-302.5) 665,-312.5 635,-312.5 cw(c635,-302.5) 625,-302.5 625,-250 ; 862.5,-250 862.5,-312.5 835,-312.5 cw(c835,-302.5) 825,-302.5 825,-250 862.5,-250 ; -775,-302.5 -775,-250 -725,-250 -725,-302.5 cw(c-735,-302.5) -735,-312.5 -765,-312.5 cw(c-765,-302.5) -775,-302.5 ; -675,-302.5 -675,-250 -625,-250 -625,-302.5 cw(c-635,-302.5) -635,-312.5 -665,-312.5 cw(c-665,-302.5) -675,-302.5 ; -575,-302.5 -575,-250 -525,-250 -525,-302.5 cw(c-535,-302.5) -535,-312.5 -565,-312.5 cw(c-565,-302.5) -575,-302.5 ; -475,-302.5 -475,-250 -425,-250 -425,-302.5 cw(c-435,-302.5) -435,-312.5 -465,-312.5 cw(c-465,-302.5) -475,-302.5 ; -375,-302.5 -375,-250 -325,-250 -325,-302.5 cw(c-335,-302.5) -335,-312.5 -365,-312.5 cw(c-365,-302.5) -375,-302.5 ; -275,-302.5 -275,-250 -225,-250 -225,-302.5 cw(c-235,-302.5) -235,-312.5 -265,-312.5 cw(c-265,-302.5) -275,-302.5 ; -175,-302.5 -175,-250 -125,-250 -125,-302.5 cw(c-135,-302.5) -135,-312.5 -165,-312.5 cw(c-165,-302.5) -175,-302.5 ; -75,-302.5 -75,-250 -25,-250 -25,-302.5 cw(c-35,-302.5) -35,-312.5 -65,-312.5 cw(c-65,-302.5) -75,-302.5 ; 25,-302.5 25,-250 75,-250 75,-302.5 cw(c65,-302.5) 65,-312.5 35,-312.5 cw(c35,-302.5) 25,-302.5 ; 125,-302.5 125,-250 175,-250 175,-302.5 cw(c165,-302.5) 165,-312.5 135,-312.5 cw(c135,-302.5) 125,-302.5 ; 725,-302.5 725,-250 775,-250 775,-302.5 cw(c765,-302.5) 765,-312.5 735,-312.5 cw(c735,-302.5) 725,-302.5

## 70553-18 [mil]
pads (18):
  oval 64.5x129 hole 43: 1(-850,-300) 2(-750,-300) 3(-650,-300) 4(-550,-300) 5(-450,-300) 6(-350,-300) 7(-250,-300) 8(-150,-300) 9(-50,-300) 10(50,-300) 11(150,-300) 12(250,-300) 13(350,-300) 14(450,-300) 15(550,-300) 16(650,-300) 17(750,-300) 18(850,-300)
Top Overlay:
  region: 0,0 10,0 10,10 0,10
  lines w10: -162.5,231.25 -162.5,100 -125,100 ; -125,100 -50,100 -50,-125 50,-125 50,100 125,100 ; -125,100 -125,125 cw(c-75,125) -75,175 75,175 cw(c75,125) 125,125 125,100 ; 125,100 162.5,100 162.5,231.25 ; 162.5,231.25 943.75,231.25 943.75,-225 -943.75,-225 -943.75,231.25 162.5,231.25
Mechanical 16:
  rectangle: -862.5,-300 -837.5,-250
  rectangle: -762.5,-300 -737.5,-250
  rectangle: -662.5,-300 -637.5,-250
  rectangle: -562.5,-300 -537.5,-250
  rectangle: -462.5,-300 -437.5,-250
  rectangle: -362.5,-300 -337.5,-250
  rectangle: -262.5,-300 -237.5,-250
  rectangle: -162.5,-300 -137.5,-250
  rectangle: -62.5,-300 -37.5,-250
  rectangle: 37.5,-300 62.5,-250
  rectangle: 837.5,-300 862.5,-250
  rectangle: 137.5,-300 162.5,-250
  rectangle: 237.5,-300 262.5,-250
  rectangle: 337.5,-300 362.5,-250
  rectangle: 437.5,-300 462.5,-250
  rectangle: 537.5,-300 562.5,-250
  rectangle: 637.5,-300 662.5,-250
  rectangle: 737.5,-300 762.5,-250
  lines w5: -875,-250 -825,-250 ; -775,-250 -725,-250 ; -675,-250 -625,-250 ; -575,-250 -525,-250 ; -475,-250 -425,-250 ; -375,-250 -325,-250 ; -275,-250 -225,-250 ; -175,-250 -125,-250 ; -75,-250 -25,-250 ; 25,-250 75,-250 ; 125,-250 175,-250 ; 325,-250 375,-250 ; 625,-250 675,-250 ; 725,-250 775,-250 ; 825,-250 875,-250
  lines w10: -912.5,-225 -912.5,-312.5 -885,-312.5 ccw(c-885,-302.5) -875,-302.5 -875,-250 ; 475,-250 475,-302.5 ccw(c485,-302.5) 485,-312.5 515,-312.5 ccw(c515,-302.5) 525,-302.5 525,-250 ; 912.5,-225 912.5,-250 ; 225,-250 175,-250 175,-302.5 ccw(c185,-302.5) 185,-312.5 215,-312.5 ccw(c215,-302.5) 225,-302.5 225,-250 ; 225,-250 275,-250 ; 275,-250 325,-250 325,-302.5 cw(c315,-302.5) 315,-312.5 285,-312.5 cw(c285,-302.5) 275,-302.5 275,-250 ; 425,-250 575,-250 ; 425,-250 375,-250 375,-302.5 ccw(c385,-302.5) 385,-312.5 415,-312.5 ccw(c415,-302.5) 425,-302.5 425,-250 ; 575,-250 625,-250 625,-302.5 cw(c615,-302.5) 615,-312.5 585,-312.5 cw(c585,-302.5) 575,-302.5 575,-250 ; 912.5,-250 912.5,-312.5 885,-312.5 cw(c885,-302.5) 875,-302.5 875,-250 912.5,-250 ; -825,-302.5 -825,-250 -775,-250 -775,-302.5 cw(c-785,-302.5) -785,-312.5 -815,-312.5 cw(c-815,-302.5) -825,-302.5 ; -725,-302.5 -725,-250 -675,-250 -675,-302.5 cw(c-685,-302.5) -685,-312.5 -715,-312.5 cw(c-715,-302.5) -725,-302.5 ; -625,-302.5 -625,-250 -575,-250 -575,-302.5 cw(c-585,-302.5) -585,-312.5 -615,-312.5 cw(c-615,-302.5) -625,-302.5 ; -525,-302.5 -525,-250 -475,-250 -475,-302.5 cw(c-485,-302.5) -485,-312.5 -515,-312.5 cw(c-515,-302.5) -525,-302.5 ; -425,-302.5 -425,-250 -375,-250 -375,-302.5 cw(c-385,-302.5) -385,-312.5 -415,-312.5 cw(c-415,-302.5) -425,-302.5 ; -325,-302.5 -325,-250 -275,-250 -275,-302.5 cw(c-285,-302.5) -285,-312.5 -315,-312.5 cw(c-315,-302.5) -325,-302.5 ; -225,-302.5 -225,-250 -175,-250 -175,-302.5 cw(c-185,-302.5) -185,-312.5 -215,-312.5 cw(c-215,-302.5) -225,-302.5 ; -125,-302.5 -125,-250 -75,-250 -75,-302.5 cw(c-85,-302.5) -85,-312.5 -115,-312.5 cw(c-115,-302.5) -125,-302.5 ; -25,-302.5 -25,-250 25,-250 25,-302.5 cw(c15,-302.5) 15,-312.5 -15,-312.5 cw(c-15,-302.5) -25,-302.5 ; 75,-302.5 75,-250 125,-250 125,-302.5 cw(c115,-302.5) 115,-312.5 85,-312.5 cw(c85,-302.5) 75,-302.5 ; 675,-302.5 675,-250 725,-250 725,-302.5 cw(c715,-302.5) 715,-312.5 685,-312.5 cw(c685,-302.5) 675,-302.5 ; 775,-302.5 775,-250 825,-250 825,-302.5 cw(c815,-302.5) 815,-312.5 785,-312.5 cw(c785,-302.5) 775,-302.5

## 70553-19 [mil]
pads (19):
  oval 64.5x129 hole 43: 1(-900,-300) 2(-800,-300) 3(-700,-300) 4(-600,-300) 5(-500,-300) 6(-400,-300) 7(-300,-300) 8(-200,-300) 9(-100,-300) 10(0,-300) 11(100,-300) 12(200,-300) 13(300,-300) 14(400,-300) 15(500,-300) 16(600,-300) 17(700,-300) 18(800,-300) 19(900,-300)
Top Overlay:
  region: 0,0 10,0 10,10 0,10
  lines w10: -162.5,231.25 -162.5,100 -125,100 ; -125,100 -50,100 -50,-125 50,-125 50,100 125,100 ; -125,100 -125,125 cw(c-75,125) -75,175 75,175 cw(c75,125) 125,125 125,100 ; 125,100 162.5,100 162.5,231.25 ; 162.5,231.25 993.75,231.25 993.75,-225 -993.75,-225 -993.75,231.25 162.5,231.25
Mechanical 16:
  drawing of 154 lines, arcs and shapes, not listed

## 70553-20 [mil]
pads (20):
  oval 64.5x129 hole 43: 1(-950,-300) 2(-850,-300) 3(-750,-300) 4(-650,-300) 5(-550,-300) 6(-450,-300) 7(-350,-300) 8(-250,-300) 9(-150,-300) 10(-50,-300) 11(50,-300) 12(150,-300) 13(250,-300) 14(350,-300) 15(450,-300) 16(550,-300) 17(650,-300) 18(750,-300) 19(850,-300) 20(950,-300)
Top Overlay:
  region: 0,0 10,0 10,10 0,10
  lines w10: -162.5,231.25 -162.5,100 -125,100 ; -125,100 -50,100 -50,-125 50,-125 50,100 125,100 ; -125,100 -125,125 cw(c-75,125) -75,175 75,175 cw(c75,125) 125,125 125,100 ; 125,100 162.5,100 162.5,231.25 ; 162.5,231.25 1043.75,231.25 1043.75,-225 -1043.75,-225 -1043.75,231.25 162.5,231.25
Mechanical 16:
  drawing of 162 lines, arcs and shapes, not listed

## 70553-21 [mil]
pads (21):
  oval 64.5x129 hole 43: 1(-1000,-300) 2(-900,-300) 3(-800,-300) 4(-700,-300) 5(-600,-300) 6(-500,-300) 7(-400,-300) 8(-300,-300) 9(-200,-300) 10(-100,-300) 11(0,-300) 12(100,-300) 13(200,-300) 14(300,-300) 15(400,-300) 16(500,-300) 17(600,-300) 18(700,-300) 19(800,-300) 20(900,-300) 21(1000,-300)
Top Overlay:
  region: 0,0 10,0 10,10 0,10
  lines w10: -162.5,231.25 -162.5,100 -125,100 ; -125,100 -50,100 -50,-125 50,-125 50,100 125,100 ; -125,100 -125,125 cw(c-75,125) -75,175 75,175 cw(c75,125) 125,125 125,100 ; 125,100 162.5,100 162.5,231.25 ; 162.5,231.25 1093.75,231.25 1093.75,-225 -1093.75,-225 -1093.75,231.25 162.5,231.25
Mechanical 16:
  drawing of 170 lines, arcs and shapes, not listed